# Altium footprint library Other.PcbLib: 104 footprints (part 3 of 7)
Each footprint in its own frame and in the unit in brackets; x right, y up, seen from the top. Pads: shape width x height; smd on the part's side, far side on the other; paste and mask are expansions set on the pad; w line width, h text height; cw(c..) or ccw(c..) is an arc to the next point about the centre after c.
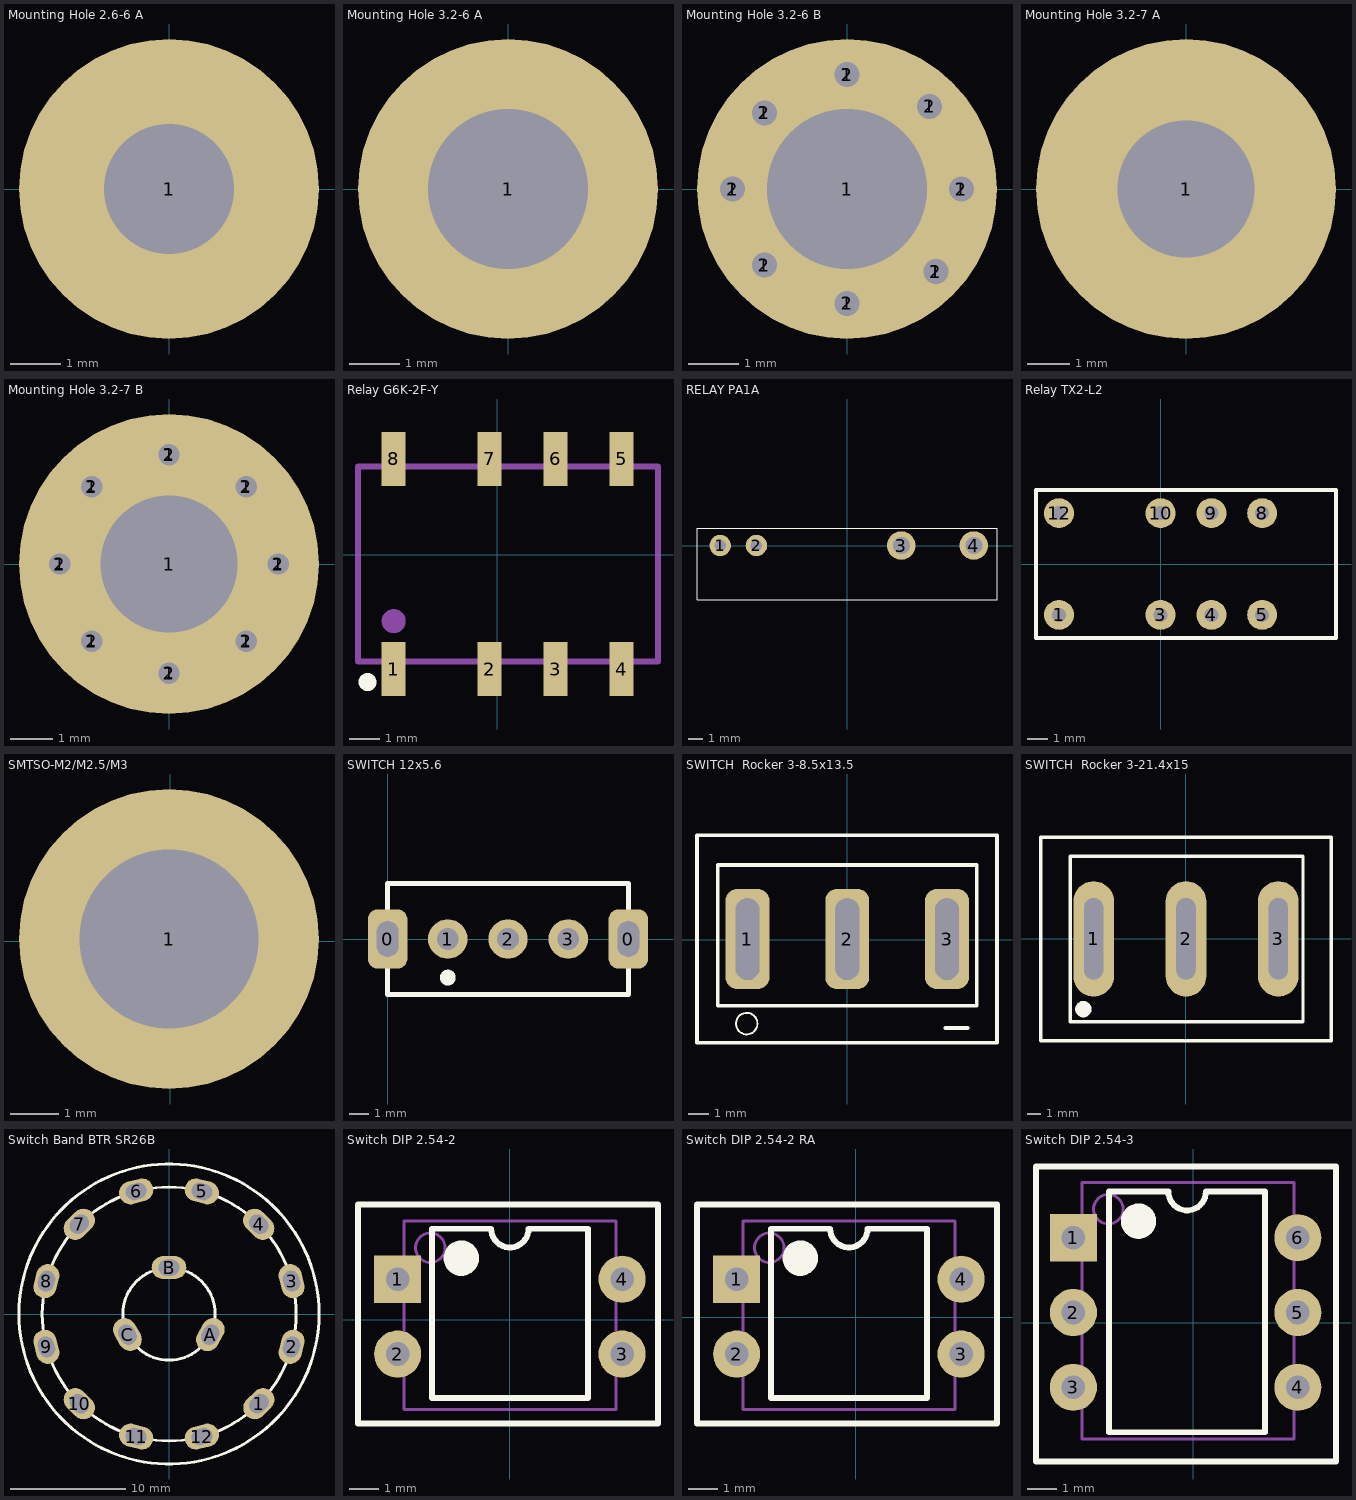
[diagram p2: the footprints below, top view; thin cyan lines are the x and y axes]

## Mounting Hole 2.6-6 A [mm] "2.5mm固定孔"
pads (1):
  round 6 hole 2.6: 1(0,0)
3D body "TR Fastenings Ltd-M2_5X6MM.step": height 5.5, standoff -3, extent -2.25,-2.25 2.25,2.25

## Mounting Hole 3.2-6 A [mm] "3mm固定孔"
pads (1):
  round 6 hole 3.2: 1(0,0)
3D body "User Library-Spacer-M3-10mm.STEP": height 10.1, standoff -8.08, extent -2.886,-2.523 2.886,2.524

## Mounting Hole 3.2-6 B [mm] "3mm固定孔"
pads (17):
  round 0.5 hole 0.5: 1(-2.286,0) 1(-1.651,-1.524) 1(-1.651,1.524) 1(0,-2.286) 1(0,2.286) 1(1.651,1.651) 1(1.778,-1.651) 1(2.286,0)
  round 6 hole 3.2 paste-4: 1(0,0)
  round 1.2 on Top Paste: 2(-2.286,0) 2(-1.651,-1.524) 2(-1.651,1.524) 2(0,-2.286) 2(0,2.286) 2(1.651,1.651) 2(1.778,-1.651) 2(2.286,0)
3D body "User Library-Spacer-M3-10mm.STEP": height 10.1, standoff -8.08, extent -2.886,-2.523 2.886,2.524

## Mounting Hole 3.2-7 A [mm] "3mm固定孔"
pads (1):
  round 7 hole 3.2: 1(0,0)
3D body "User Library-Spacer-M3-10mm.STEP": height 10.1, standoff -8.08, extent -2.886,-2.523 2.886,2.524

## Mounting Hole 3.2-7 B [mm] "3mm固定孔"
pads (17):
  round 0.5 hole 0.5: 1(-2.55,0) 1(-1.803,-1.803) 1(-1.803,1.803) 1(0,-2.55) 1(0,2.55) 1(1.803,-1.803) 1(1.803,1.803) 1(2.55,0)
  round 7 hole 3.2 paste-4: 1(0,0)
  round 1.6 on Top Paste: 2(-2.55,0) 2(-1.803,-1.803) 2(-1.803,1.803) 2(0,-2.55) 2(0,2.55) 2(1.803,-1.803) 2(1.803,1.803) 2(2.55,0)
3D body "User Library-Spacer-M3-10mm.STEP": height 10.1, standoff -8.08, extent -2.886,-2.523 2.886,2.524

## Relay G6K-2F-Y [mm]
pads (8):
  rect 0.8x1.8 smd: 1(-3.444,-3.805) 2(-0.244,-3.805) 3(1.956,-3.805) 4(4.156,-3.805) 5(4.156,3.195) 6(1.956,3.195) 7(-0.244,3.195) 8(-3.444,3.195)
Top Overlay:
  circle w0.3: c-4.318,-4.242 r0.15
Mechanical 15:
  circle w0.4: c-3.444,-2.21 r0.2
  lines w0.203: -4.634,-3.555 -4.634,2.945 5.366,2.945 5.366,-3.555 -4.634,-3.555
3D body "Relay G6K-2F-Y.stp": height 5.2, standoff 0, extent -4.644,-4.205 5.356,3.595

## RELAY PA1A [mm] "松下5APALA继电器"
pads (4):
  round 1.5 hole 0.8: 1(-8.89,0) 2(-6.35,0)
  round 2 hole 1.2: 3(3.81,0) 4(8.89,0)
Top Overlay:
  lines w0.076: -10.516,-3.81 -10.516,1.219 10.516,1.219 10.516,-3.81 -10.516,-3.81
3D body "Relay PA1A.STEP": height 12.5, standoff -3.5, extent -10.495,-3.8 10.505,1.2

## Relay TX2-L2 [mm]
pads (8):
  round 1.5 hole 0.7: 1(-5.08,-2.54) 3(0,-2.54) 4(2.54,-2.54) 5(5.08,-2.54) 8(5.08,2.54) 9(2.54,2.54) 10(0,2.54) 12(-5.08,2.54)
Top Overlay:
  lines w0.203: -6.23,-3.7 8.77,-3.7 8.77,3.7 -6.23,3.7 -6.23,-3.7
3D body "Relay TX2-L.STEP": height 8.9, standoff -3.45, extent -6.23,-3.7 8.77,3.7

## SMTSO-M2/M2.5/M3 [mm] "2mm 2.5mm 3.0mmSMT螺母"
pads (1):
  round 6.2 hole 3.7: 1(-0.025,0.051)
Top Paste:
  drawing of 40 lines, arcs and shapes, not listed
3D body "User Library-SMTSO-M3-3ET.step": height 3.03, standoff -1.5, extent -2.805,-2.729 2.755,2.831

## SWITCH 12x5.6 [mm] "5脚2档 12*5.6mm"
pads (5):
  rrect50% 2x3 hole 1.1 slot 1.8 at 90 deg: 0(0,0) 0(12.192,0)
  round 2 hole 1.1: 1(3.048,0) 2(6.096,0) 3(9.144,0)
Top Overlay:
  circle w0.4: c3.048,-1.956 r0.2
  lines w0.254: 0,-2.8 0,2.8 12.192,2.8 12.192,-2.8 0,-2.8
3D body: height 5, standoff 0, extent 0,-2.642 12.192,2.616
3D body: height 8, standoff 5, extent 8.052,-0.991 10.185,1.067
3D body: height 0, standoff -1, extent 9.017,-0.457 9.322,0.432
3D body: height 0, standoff -1, extent 5.969,-0.47 6.274,0.419
3D body: height 0, standoff -1, extent 2.921,-0.457 3.226,0.432
3D body: height 0, standoff -1, extent 0,-0.457 0.305,0.432
3D body: height 0, standoff -1, extent 11.887,-0.47 12.192,0.419

## SWITCH  Rocker 3-8.5x13.5 [mm] "单通船型开关"
pads (3):
  rrect50% 2.2x5 hole 1.2 slot 4.1 at 90 deg: 1(-5,0.025) 2(0,0.025) 3(5,0.025)
Top Overlay:
  circle w0.1: c-5.042,-4.215 r0.539
  lines w0.178: -7.531,-5.18 -7.531,5.234 7.506,5.234 7.506,-5.18 -7.531,-5.18 ; -6.489,-3.326 6.49,-3.326 6.49,3.735 -6.489,3.735 -6.489,-3.326
  lines w0.2: 4.933,-4.443 6.033,-4.443
3D body "Rocker Switch.STEP": height 14.31, standoff -4.7, extent -7.528,-5.225 7.531,5.275

## SWITCH  Rocker 3-21.4x15 [mm] "单通船型开关"
pads (3):
  oval 3x8.5 hole 1.4 slot 6 at 90 deg: 1(-6.8,0) 2(0,0) 3(6.8,0)
Top Overlay:
  circle w0.6: c-7.562,-5.182 r0.3
  lines w0.254: -10.686,-7.518 10.701,-7.518 10.701,7.493 -10.686,7.493 -10.686,-7.518 ; -8.527,-6.096 8.618,-6.096 8.618,6.096 -8.527,6.096 -8.527,-6.096
3D body "Switch MIRS-101-2C Red.STEP": height 19.84, standoff -8.1, extent -10.693,-7.518 10.707,7.482

## Switch Band BTR SR26B [mm]
pads (15):
  oval 3x2 hole 1.4 slot 1.8 at 45 deg rot 45: 1(7.793,-7.772) 7(-7.772,7.776)
  oval 3x2 hole 1.4 slot 1.8 at 75 deg rot 75: 2(10.625,-2.847) 8(-10.625,2.847)
  oval 3x2 hole 1.4 slot 1.8 at 105 deg rot 105: 3(10.625,2.847) 9(-10.625,-2.847)
  oval 3x2 hole 1.4 slot 1.8 at 135 deg rot 135: 4(7.772,7.772) 10(-7.772,-7.772)
  oval 3x2 hole 1.4 slot 1.8 at 165 deg rot 165: 5(2.847,10.625) 11(-2.847,-10.625)
  oval 3x2 hole 1.4 slot 1.8 at 15 deg rot 15: 6(-2.847,10.625) 12(2.847,-10.625)
  oval 3x2 hole 1.4 slot 1.8 at 60 deg rot 60: A(3.581,-1.791)
  oval 3x2 hole 1.4 slot 1.8 at 0 deg: B(0,4.025)
  oval 3x2 hole 1.4 slot 1.8 at 120 deg rot 120: C(-3.607,-1.778)
Top Overlay:
  circle w0.254: c0.012,0 r11
  circle w0.254: c0,0 r13
  circle w0.254: c0,0 r4
3D body: height 14.2, standoff 12, extent -8,-7.998 8,7.998
3D body: height 16.2, standoff 12, extent 5.976,-1.796 9.576,1.803
3D body: height 12.2, standoff 8, extent -13,-12.996 13,12.997
3D body: height 8, standoff 0, extent -13,-12.996 13,12.997
3D body: height 20.2, standoff 12, extent -4.75,-4.749 4.75,4.749

## Switch DIP 2.54-2 [mm] "2位拨码开关"
pads (4):
  rect 1.6x1.6 hole 0.8: 1(-3.81,1.372)
  round 1.6 hole 0.8: 2(-3.81,-1.168) 3(3.81,-1.168) 4(3.81,1.372)
Top Overlay:
  circle w0.6: c-1.65,2.086 r0.3
  lines w0.2: -2.65,-2.667 -2.65,3.086 -0.635,3.086 ccw(c0,3.086) 0.635,3.086 2.65,3.086 2.65,-2.667 -2.65,-2.667
  lines w0.203: 5.029,-3.531 -5.156,-3.531 -5.156,3.912 5.029,3.912 5.029,-3.505
Mechanical 13:
  circle w0.1: c-2.7,2.441 r0.5
  lines w0.1: -3.6,-3.048 -3.6,3.341 3.6,3.341 3.6,-3.048 -3.6,-3.048
3D body "User Library-DIP SW 2P TH.step": height 8.5, standoff -3.8, extent -4.941,-3.543 4.839,3.797

## Switch DIP 2.54-2 RA [mm] "2位拨码开关"
pads (4):
  rect 1.6x1.6 hole 0.8: 1(-4.039,1.295)
  round 1.6 hole 0.8: 2(-4.039,-1.245) 3(3.581,-1.245) 4(3.581,1.295)
Top Overlay:
  circle w0.6: c-1.879,2.01 r0.3
  lines w0.2: -2.879,-2.743 -2.879,3.01 -0.864,3.01 ccw(c-0.229,3.01) 0.406,3.01 2.421,3.01 2.421,-2.743 -2.879,-2.743
  lines w0.203: 4.801,-3.607 -5.385,-3.607 -5.385,3.835 4.801,3.835 4.801,-3.581
Mechanical 13:
  circle w0.1: c-2.929,2.365 r0.5
  lines w0.1: -3.829,-3.124 -3.829,3.265 3.371,3.265 3.371,-3.124 -3.829,-3.124
3D body "User Library-DIP SW 2P TH RA.step": height 7.9, standoff -3.8, extent -6.208,-3.579 4.712,3.681

## Switch DIP 2.54-3 [mm] "2位拨码开关"
pads (6):
  rect 1.6x1.6 hole 0.8: 1(-4.064,2.896)
  round 1.6 hole 0.8: 2(-4.064,0.356) 3(-4.064,-2.184) 4(3.556,-2.184) 5(3.556,0.356) 6(3.556,2.896)
Top Overlay:
  circle w0.6: c-1.853,3.458 r0.3
  lines w0.2: -2.853,-3.708 2.447,-3.708 2.447,4.458 0.432,4.458 cw(c-0.203,4.458) -0.838,4.458 -2.853,4.458 -2.853,-3.708
  lines w0.203: -5.334,-4.47 -5.334,5.309 4.851,5.309 4.851,-4.47 ; -5.334,-4.42 -5.334,-4.699 4.851,-4.699 4.851,-3.861
Mechanical 13:
  circle w0.1: c-2.878,3.863 r0.5
  lines w0.1: -3.778,-3.937 3.422,-3.937 3.422,4.763 -3.778,4.763 -3.778,-3.937
3D body "User Library-DIP SW 3P TH.step": height 8.5, standoff -3.8, extent -5.22,-4.61 4.56,5.27